# Altium footprint library PCB_LIB.PcbLib: 116 footprints (part 3 of 8)
Each footprint in its own frame and in the unit in brackets; x right, y up, seen from the top. Pads: shape width x height; smd on the part's side, far side on the other; paste and mask are expansions set on the pad; w line width, h text height; cw(c..) or ccw(c..) is an arc to the next point about the centre after c.
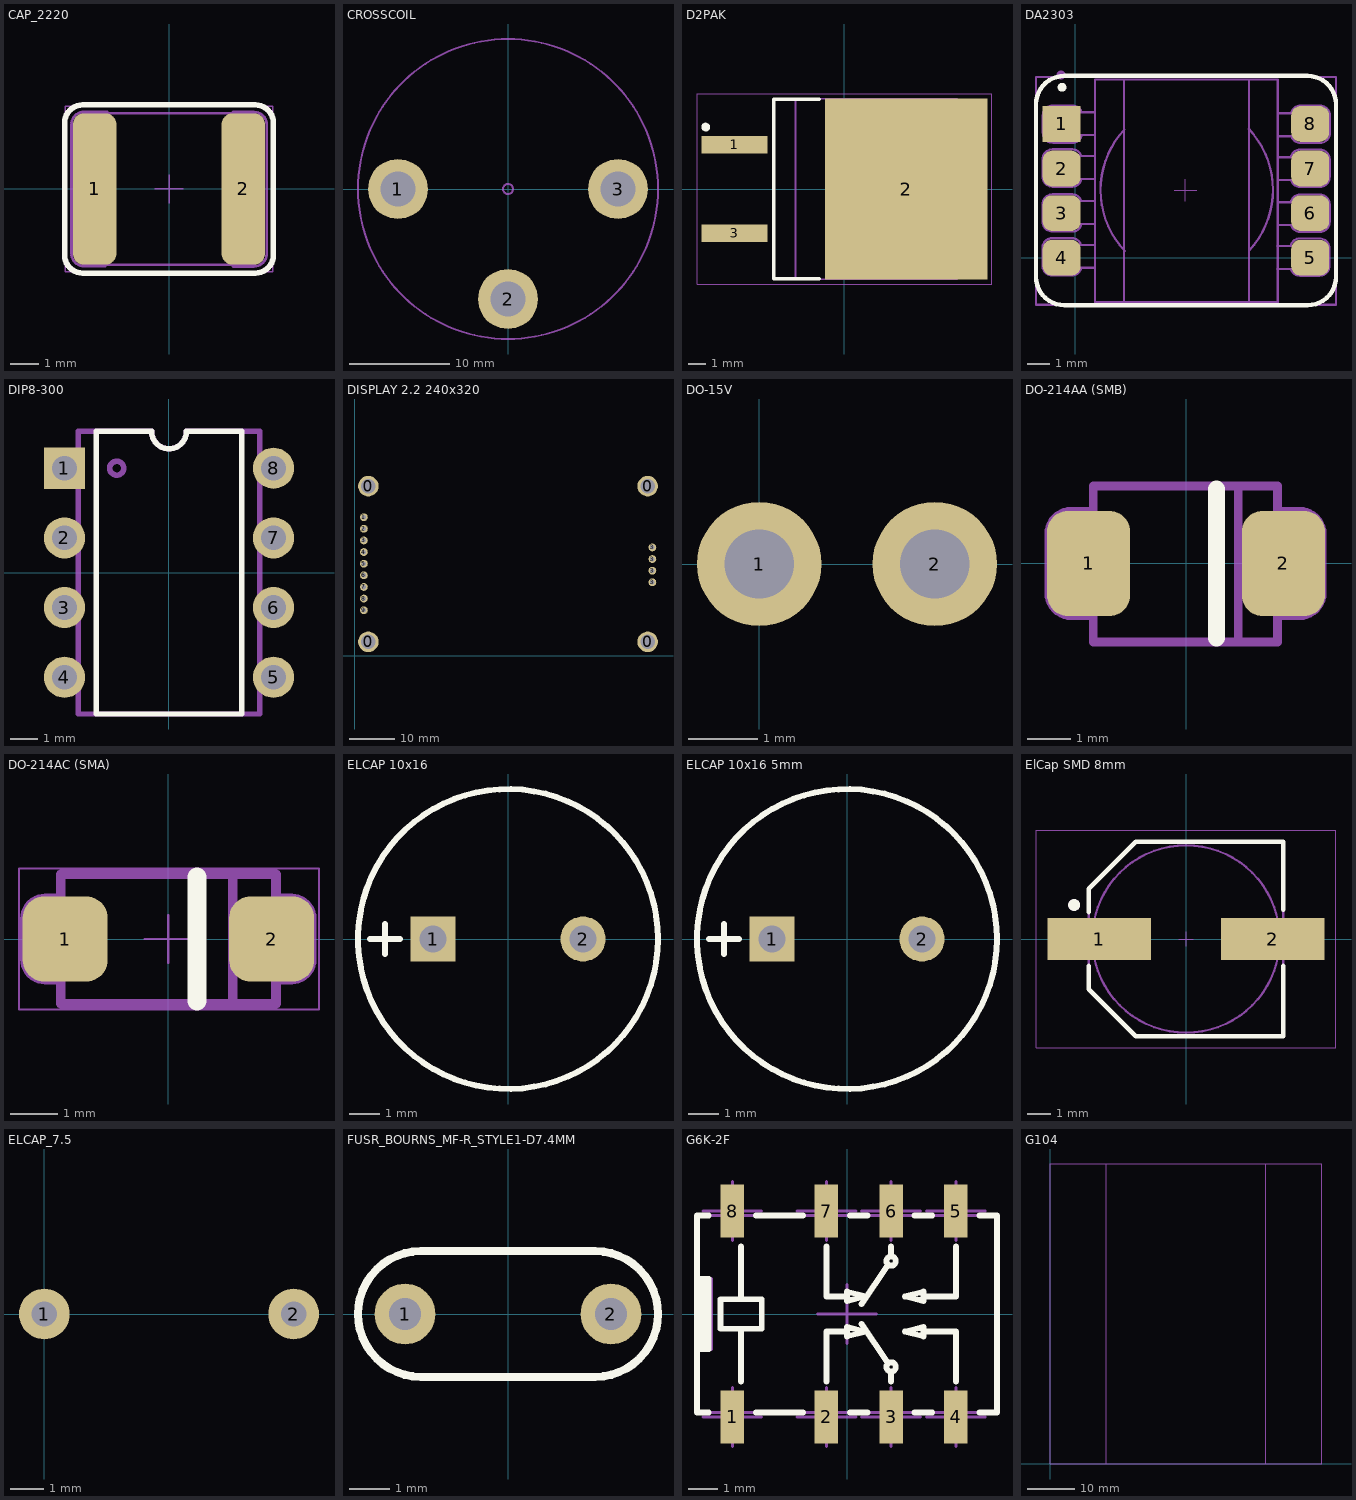
[diagram p2: the footprints below, top view; thin cyan lines are the x and y axes]

## CAP_2220 [mm] "Chip Capacitor, 2-Leads, Body 5.7x5.0mm, IPC Medium Density"
height 2
pads (2):
  rrect50% 1.55x5.4 smd: 1(-2.65,0) 2(2.65,0)
Top Overlay:
  lines w0.2: -3.725,2.3 -3.725,-2.35 ccw(c-3.075,-2.35) -3.075,-3 3.075,-3 ccw(c3.075,-2.35) 3.725,-2.35 ; -3.725,2.35 cw(c-3.075,2.35) -3.075,3 3.075,3 cw(c3.075,2.35) 3.725,2.35 3.725,-2.3
Mechanical 14:
  lines w0.1: -2.275,-2.753 -3.025,-2.753 cw(c-3.025,-2.3) -3.478,-2.3 ; -2.21,2.753 -3.025,2.753 ccw(c-3.025,2.3) -3.478,2.3 ; 2.285,-2.76 3.035,-2.76 ccw(c3.035,-2.307) 3.487,-2.307 3.487,2.293 ccw(c3.035,2.293) 3.035,2.746 2.285,2.746 ; -3.478,-2.3 -3.478,2.3 ; -3.478,-2.3 -3.478,-2.3 ; -3.478,2.3 -3.478,2.3 ; -3.05,-2.7 3.05,-2.7 3.05,2.7 -3.05,2.7 -3.05,-2.7
  text ".Designator" at -5.715,0 h2.8
  text ".Comment" at -1.651,-2.159 h1
Mechanical 15:
  lines w0.05: -0.5,0 0.5,0 ; 0,-0.5 0,0.5 ; -3.7,-2.95 3.7,-2.95 3.7,2.95 -3.7,2.95 -3.7,-2.95
3D body "CAPC5750X200N.stp": height 2, standoff 0, extent -3.05,-2.7 3.05,2.7

## CROSSCOIL [mm]
pads (3):
  round 6 hole 3.5: 1(-11,0) 2(0,-11) 3(11,0)
Mechanical 2:
  circle w0.2: c-11,0 r1.5
  circle w0.2: c11,0 r1.5
  circle w0.2: c0,-11 r1.5
  circle w0.2: c0,0 r0.5
Mechanical 14:
  circle w0.2: c0,0 r15
3D body: height 26, standoff 0, extent -14.999,-14.999 14.999,14.999
3D body: height 29, standoff 26, extent -0.499,-0.499 0.499,0.499
3D body: height 0, standoff -11, extent 9.501,-1.499 12.499,1.499
3D body: height 0, standoff -11, extent -1.499,-12.499 1.499,-9.501
3D body: height 0, standoff -11, extent -12.499,-1.499 -9.501,1.499

## D2PAK [mm] "D2PAK TO-263A, TO,2.54mm pitch;2 pin,15.24mm L X 9.27mm W X 4.57mm H body, IPC Medium Density"
height 4.57
pads (3):
  rect 3.8x1 smd: 1(-6.3,2.54) 3(-6.3,-2.54)
  rect 9.3x10.4 smd: 2(3.55,0)
Top Overlay:
  circle w0.25: c-7.95,3.55 r0.125
  lines w0.2: -1.45,-5.15 -4.05,-5.15 -4.05,5.15 -1.45,5.15
Top Paste:
  region: -0.37,-4.48 1.05,-4.48 1.05,-2.78 -0.37,-2.78
  region: 1.77,-4.48 3.19,-4.48 3.19,-2.78 1.77,-2.78
  region: 3.91,-4.48 5.33,-4.48 5.33,-2.78 3.91,-2.78
  region: 6.05,-4.48 7.47,-4.48 7.47,-2.78 6.05,-2.78
  region: -0.37,-2.06 1.05,-2.06 1.05,-0.36 -0.37,-0.36
  region: 1.77,-2.06 3.19,-2.06 3.19,-0.36 1.77,-0.36
  region: 3.91,-2.06 5.33,-2.06 5.33,-0.36 3.91,-0.36
  region: 6.05,-2.06 7.47,-2.06 7.47,-0.36 6.05,-0.36
  region: -0.37,0.36 1.05,0.36 1.05,2.06 -0.37,2.06
  region: 1.77,0.36 3.19,0.36 3.19,2.06 1.77,2.06
  region: 3.91,0.36 5.33,0.36 5.33,2.06 3.91,2.06
  region: 6.05,0.36 7.47,0.36 7.47,2.06 6.05,2.06
  region: -0.37,2.78 1.05,2.78 1.05,4.48 -0.37,4.48
  region: 1.77,2.78 3.19,2.78 3.19,4.48 1.77,4.48
  region: 3.91,2.78 5.33,2.78 5.33,4.48 3.91,4.48
  region: 6.05,2.78 7.47,2.78 7.47,4.48 6.05,4.48
Mechanical 14:
  lines w0.1: 6.47,-5.08 6.85,-5.08 7.62,-4.226 7.62,4.226 6.85,5.08 6.47,5.08 ; -2.8,-5.17 -2.8,5.17 6.47,5.17 6.47,-5.17 -2.8,-5.17
Mechanical 15:
  lines w0.05: -0.5,0 0.5,0 ; 0,-0.5 0,0.5 ; -8.45,-5.45 -8.45,5.45 8.45,5.45 8.45,-5.45 -8.45,-5.45
3D body "TO254P1524X483-3N.stp": height 4.83, standoff 0, extent -7.622,-5.08 7.623,5.08

## DA2303 [mm]
pads (8):
  rect 1.7x1.6 smd: 1(-0.6,6)
  rrect50% 1.7x1.6 smd: 2(-0.6,4) 3(-0.6,2) 4(-0.6,0) 5(10.55,0) 6(10.55,2) 7(10.55,4) 8(10.55,6)
Top Overlay:
  circle w0.2: c-0.583,7.645 r0.1
  lines w0.2: -1.753,-0.864 ccw(c-0.483,-0.864) -0.483,-2.134 10.439,-2.134 ccw(c10.439,-0.864) 11.709,-0.864 11.709,6.883 ccw(c10.439,6.883) 10.439,8.153 -0.483,8.153 ccw(c-0.483,6.883) -1.753,6.883 -1.753,6.223 -1.753,-0.864
Mechanical 14:
  circle w0.2: c-0.629,8.195 r0.1
  lines w0.1: -1.467,0.024 -1.467,0.424 cw(c-1.017,0.424) -1.017,0.874 -0.142,0.874 cw(c-0.142,0.449) 0.257,0.594 ; -1.467,0.049 -1.467,-0.351 ccw(c-1.017,-0.351) -1.017,-0.801 -0.142,-0.801 ccw(c-0.142,-0.376) 0.257,-0.522 ; -1.456,1.993 -1.456,2.393 cw(c-1.006,2.393) -1.006,2.843 -0.131,2.843 cw(c-0.131,2.418) 0.268,2.564 ; -1.456,2.018 -1.456,1.618 ccw(c-1.006,1.618) -1.006,1.168 -0.131,1.168 ccw(c-0.131,1.593) 0.268,1.448 ; -1.456,4.012 -1.456,4.412 cw(c-1.006,4.412) -1.006,4.862 -0.131,4.862 cw(c-0.131,4.437) 0.268,4.582 ; -1.456,4.037 -1.456,3.637 ccw(c-1.006,3.637) -1.006,3.187 -0.131,3.187 ccw(c-0.131,3.612) 0.268,3.466 ; -1.445,5.981 -1.445,6.381 cw(c-0.995,6.381) -0.995,6.831 -0.12,6.831 cw(c-0.12,6.406) 0.279,6.551 ; -1.445,6.006 -1.445,5.606 ccw(c-0.995,5.606) -0.995,5.156 -0.12,5.156 ccw(c-0.12,5.581) 0.279,5.436 ; 0.878,-0.457 -0.922,-0.457 cw(c-0.922,-0.207) -1.172,-0.207 -1.172,0.318 ; 0.878,0.568 -0.922,0.568 ccw(c-0.922,0.318) -1.172,0.318 ; 0.889,1.512 -0.911,1.512 cw(c-0.911,1.762) -1.161,1.762 -1.161,2.287 ; 0.889,2.537 -0.911,2.537 ccw(c-0.911,2.287) -1.161,2.287 ; 0.889,3.531 -0.911,3.531 cw(c-0.911,3.781) -1.161,3.781 -1.161,4.306 ; 0.889,4.556 -0.911,4.556 ccw(c-0.911,4.306) -1.161,4.306 ; 0.9,5.5 -0.9,5.5 cw(c-0.9,5.75) -1.15,5.75 -1.15,6.275 ; 0.9,6.525 -0.9,6.525 ccw(c-0.9,6.275) -1.15,6.275 ; 2.2,-2 2.2,8 ; 2.204,5.747 ccw(c5.144,3.035) 2.226,0.299 ; 7.799,5.776 cw(c4.881,3.04) 7.821,0.328 ; 7.8,-2 7.8,8 ; 9.071,-0.505 10.871,-0.505 ccw(c10.871,-0.255) 11.121,-0.255 ; 9.071,0.52 10.871,0.52 cw(c10.871,0.27) 11.121,0.27 11.121,-0.255 ; 9.082,1.464 10.882,1.464 ccw(c10.882,1.714) 11.132,1.714 ; 9.082,2.489 10.882,2.489 cw(c10.882,2.239) 11.132,2.239 11.132,1.714 ; 9.082,3.483 10.882,3.483 ccw(c10.882,3.733) 11.132,3.733 ; 9.082,4.508 10.882,4.508 cw(c10.882,4.258) 11.132,4.258 11.132,3.733 ; 9.093,5.452 10.893,5.452 ccw(c10.893,5.702) 11.143,5.702 ; 9.093,6.477 10.893,6.477 cw(c10.893,6.227) 11.143,6.227 11.143,5.702 ; 9.692,-0.532 ccw(c10.091,-0.386) 10.091,-0.811 10.966,-0.811 ccw(c10.966,-0.361) 11.416,-0.361 11.416,0.039 ; 9.692,0.584 cw(c10.091,0.439) 10.091,0.864 10.966,0.864 cw(c10.966,0.414) 11.416,0.414 11.416,0.014 ; 9.703,1.438 ccw(c10.102,1.583) 10.102,1.158 10.977,1.158 ccw(c10.977,1.608) 11.427,1.608 11.427,2.008 ; 9.703,2.554 cw(c10.102,2.408) 10.102,2.833 10.977,2.833 cw(c10.977,2.383) 11.427,2.383 11.427,1.983 ; 9.703,3.456 ccw(c10.102,3.602) 10.102,3.177 10.977,3.177 ccw(c10.977,3.627) 11.427,3.627 11.427,4.027 ; 9.703,4.572 cw(c10.102,4.427) 10.102,4.852 10.977,4.852 cw(c10.977,4.402) 11.427,4.402 11.427,4.002 ; 9.714,5.426 ccw(c10.113,5.571) 10.113,5.146 10.988,5.146 ccw(c10.988,5.596) 11.438,5.596 11.438,5.996 ; 9.714,6.541 cw(c10.113,6.396) 10.113,6.821 10.988,6.821 cw(c10.988,6.371) 11.438,6.371 11.438,5.971 ; -1.172,0.318 ccw(c-1.172,0.318) -1.172,0.318 ; -1.161,2.287 ccw(c-1.161,2.287) -1.161,2.287 ; -1.161,4.306 ccw(c-1.161,4.306) -1.161,4.306 ; -1.15,6.275 ccw(c-1.15,6.275) -1.15,6.275 ; 11.121,-0.255 ccw(c11.121,-0.255) 11.121,-0.255 ; 11.132,1.714 ccw(c11.132,1.714) 11.132,1.714 ; 11.132,3.733 ccw(c11.132,3.733) 11.132,3.733 ; 11.143,5.702 ccw(c11.143,5.702) 11.143,5.702 ; 0.9,-2 9.1,-2 9.1,8 0.9,8 0.9,-2
  text ".Designator" at 2.975,13.325 h5
  text ".Comment" at -3.275,-4.325 h1.5
Mechanical 15:
  lines w0.05: 4.453,3.023 5.453,3.023 ; 4.953,2.523 4.953,3.523
  lines w0.1: -1.753,-2.108 4.902,-2.108 11.709,-2.108 11.709,8.103 -1.753,8.103 -1.753,-2.108
3D body "Coilcraft-DA2303-AL.step": height 5.95, standoff -0.02, extent -1.075,-1.975 10.995,8.025

## DIP8-300 [mm] "DIP 8 Leads, Row Spacing 7.62 mm; Pitch 2.54 mm"
height 5.08
pads (8):
  rect 1.5x1.5 hole 0.9: 1(-3.81,3.81)
  round 1.5 hole 0.9: 2(-3.81,1.27) 3(-3.81,-1.27) 4(-3.81,-3.81) 5(3.81,-3.81) 6(3.81,-1.27) 7(3.81,1.27) 8(3.81,3.81)
Top Overlay:
  lines w0.2: -0.635,5.15 ccw(c0,5.15) 0.635,5.15 ; -0.635,5.15 ccw(c0,5.15) 0.635,5.15 ; -0.635,5.15 -2.65,5.15 -2.65,-5.15 2.65,-5.15 2.65,5.15 0.635,5.15
Mechanical 14:
  circle w0.2: c-1.905,3.81 r0.254
  lines w0.2: -3.3,-5.15 -3.3,5.15 -0.635,5.15 ccw(c0,5.15) 0.635,5.15 3.3,5.15 3.3,-5.15 -3.3,-5.15
  text ".Designator" at 1.225,-5.95 h2.8
3D body "DIP8-300.stp": height 5.33, standoff -3.3, extent -3.935,-5.08 3.935,5.08

## DISPLAY 2.2 240x320 [mm]
pads (17):
  round 4.5 hole 3.2: 0(3,3) 0(3,37) 0(64,3) 0(64,37)
  round 1.7 hole 1: 1(2.032,30.226) 2(2.032,27.686) 3(2.032,25.146) 3(65.024,16.002) 3(65.024,18.542) 3(65.024,21.082) 3(65.024,23.622) 4(2.032,22.606) 5(2.032,20.066) 6(2.032,17.526) 7(2.032,14.986) 8(2.032,12.446) 9(2.032,9.906)
3D body "User Library-TFT22.step": height 17.1, standoff -4, extent 0,0 67,40

## DO-15V [mm]
pads (2):
  round 1.8 hole 1: 1(0,0) 2(2.54,0)
3D body "User Library-DO-15-Vertical_100.STEP": height 11.05, standoff -4, extent -1.78,-1.78 2.97,1.78

## DO-214AA (SMB) [mil] "DO-214-AA/SMB; 2 C-Bend Leads; Body 5.3 x 3.6 mm, inc. leads (LxW)"
height 100
pads (2):
  rrect50% 75x95 smd: 1(-88,0) 2(88,0)
Top Overlay:
  lines w15.75: 27.56,-66.93 27.56,66.93
Mechanical 14:
  lines w7.87: -84.65,-47.24 -103.35,-47.24 cw(c-103.35,-26.57) -124.02,-26.57 -124.02,26.57 cw(c-103.35,26.57) -103.35,47.24 -83.66,47.24 ; -83.66,-37.4 -94.49,-37.4 -94.49,37.4 -83.66,37.4 ; 47.24,-69.88 47.24,69.88 ; 82.68,-47.24 102.36,-47.24 ccw(c102.36,-26.57) 123.03,-26.57 123.03,26.57 ccw(c102.36,26.57) 102.36,47.24 83.66,47.24 ; 82.68,-37.4 93.5,-37.4 93.5,37.4 82.68,37.4 ; -83.66,-70.87 -83.66,69.88 82.68,69.88 82.68,-70.87 -83.66,-70.87
  text ".Designator" at -137.8,-43.31 h70.87
3D body "SMB (DO-214AA).STEP": height 86.65, standoff -1.97, extent -104.34,-72.84 104.32,72.83

## DO-214AC (SMA) [mil] "DO-214-AC/SMA; 2 C-Bend Leads; Body 5 x 2.7 mm, inc. leads (LxW)"
height 96.06
pads (2):
  rrect50% 70x70 smd: 1(-85,0) 2(85,0)
Top Overlay:
  lines w15.75: 23.62,-51.18 23.62,51.18
Mechanical 14:
  lines w7.87: -88.58,-33.46 -101.38,-33.46 cw(c-101.38,-16.73) -118.11,-16.73 -118.11,16.73 cw(c-101.38,16.73) -101.38,33.46 -88.58,33.46 ; -88.58,-26.57 -96.46,-26.57 -96.46,26.57 -88.58,26.57 ; 53.15,-53.15 53.15,53.15 ; 88.58,-33.46 101.38,-33.46 ccw(c101.38,-16.73) 118.11,-16.73 118.11,16.73 ccw(c101.38,16.73) 101.38,33.46 88.58,33.46 ; 88.58,-26.57 96.46,-26.57 96.46,26.57 88.58,26.57 ; -88.58,-53.15 -88.58,53.15 88.58,53.15 88.58,-53.15 -88.58,-53.15
  text ".Designator" at -153.54,-43.31 h70.87
Mechanical 15:
  lines w1.97: -19.68,0 19.68,0 ; 0,-19.68 0,19.68 ; -123.03,-58.07 124.02,-58.07 124.02,58.07 -123.03,58.07 -123.03,4.92 -123.03,-58.07
3D body "SMA (DO-214AC).STEP": height 84.69, standoff -1.97, extent -98.42,-53.15 98.43,53.15

## ELCAP 10x16 [mm] "Capacitor, Radial, Pin spacing 5.0mm - Body Diameter 10.0mm X Body Height 16.0mm"
height 16
pads (2):
  rect 1.5x1.5 hole 0.9: 1(-2.5,0)
  round 1.5 hole 0.9: 2(2.5,0)
Top Overlay:
  circle w0.2: c0,0 r5
  lines w0.2: -4.6,0 -3.6,0 ; -4.1,-0.5 -4.1,0.5
Mechanical 13:
  circle w0.1: c0,0 r5
Mechanical 14:
  circle w0.1: c0,0 r5
  lines w0.1: -4.6,0 -3.6,0 ; -4.1,-0.5 -4.1,0.5
3D body "CAPPR500-1000X1600.stp": height 16, standoff -3.6, extent -5.01,-5.01 4.99,4.99

## ELCAP 10x16 5mm [mm] "Capacitor, Radial, Pin spacing 5.0mm - Body Diameter 10.0mm X Body Height 16.0mm"
height 16
pads (2):
  rect 1.5x1.5 hole 0.9: 1(-2.5,0)
  round 1.5 hole 0.9: 2(2.5,0)
Top Overlay:
  circle w0.2: c0,0 r5
  lines w0.2: -4.6,0 -3.6,0 ; -4.1,-0.5 -4.1,0.5
Mechanical 13:
  circle w0.1: c0,0 r5
Mechanical 14:
  circle w0.1: c0,0 r5
  lines w0.1: -4.6,0 -3.6,0 ; -4.1,-0.5 -4.1,0.5
  text ".Designator" at -5.5,-1.25 h2.8
3D body "CAPPR500-1000X1600.stp": height 16, standoff -3.6, extent -5.01,-5.01 4.99,4.99

## ElCap SMD 8mm [mm] "Capacitor, Aluminium Electrolytric, 8.3mm L X 8.3mm W X 10.2mm H, IPC Medium Density"
height 10.2
pads (2):
  rect 4.4x1.8 smd: 1(-3.7,0) 2(3.7,0)
Top Overlay:
  circle w0.25: c-4.775,1.45 r0.125
  lines w0.2: -4.15,-1.15 -4.15,-2.15 -2.15,-4.15 4.15,-4.15 4.15,-1.15 ; -4.15,1.15 -4.15,2.15 -2.15,4.15 4.15,4.15 4.15,1.25
Mechanical 14:
  circle w0.1: c0,0 r4
  circle w0.25: c-4.775,1.45 r0.125
  lines w0.1: -4.15,-2.15 -4.15,2.15 -2.15,4.15 4.15,4.15 4.15,-4.15 -2.15,-4.15 -4.15,-2.15
Mechanical 15:
  lines w0.05: -0.3,0 0.3,0 ; 0,-0.3 0,0.3 ; -6.4,-4.65 6.4,-4.65 6.4,4.65 -6.4,4.65 -6.4,-4.65
3D body "CAPAE830X1020N.stp": height 10.2, standoff 0, extent -4.75,-4.25 5.25,4.25

## ELCAP_7.5 [mil]
pads (2):
  round 60 hole 30: 1(0,0) 2(295.28,0)

## FUSR_BOURNS_MF-R_STYLE1-D7.4MM [mm] "PTC Resettable Fuse, MF-R Series, Case style 1 Diametre 7.4mm"
height 13.4
pads (2):
  round 1.5 hole 0.8: 1(-2.54,0) 2(2.54,0)
Top Overlay:
  lines w0.2: -3.7,0 cw(c-2.15,0) -2.15,1.55 2.15,1.55 cw(c2.15,0) 3.7,0 cw(c2.15,0) 2.15,-1.55 -2.15,-1.55 cw(c-2.15,0) -3.7,0
Mechanical 14:
  lines w0.1: -3.7,0 cw(c-2.15,0) -2.15,1.55 2.15,1.55 cw(c2.15,0) 3.7,0 cw(c2.15,0) 2.15,-1.55 -2.15,-1.55 cw(c-2.15,0) -3.7,0
  text ".Designator" at -4,-1 h1.9
3D body "FUSR_BOURNS_MF-R_STYLE1-D7.4MM.stp": height 13.4, standoff -3.6, extent -3.699,-1.55 3.699,1.55

## G6K-2F [mm] "SMD Relay,  Body 10.2mm x 6.7mm, OMRON_G6K-2F"
height 5.4
pads (8):
  rect 0.8x1.8 smd: 1(-3.9,-3.5) 2(-0.7,-3.5) 3(1.5,-3.5) 4(3.7,-3.5) 5(3.7,3.5) 6(1.5,3.5) 7(-0.7,3.5) 8(-3.9,3.5)
Top Overlay:
  circle w0.2: c1.5,1.8 r0.159
  circle w0.2: c1.5,-1.8 r0.159
  lines w0.2: -5.1,-1.2 -4.7,-1.2 -4.7,1.2 -5.1,1.2 ; -5,-1.2 -5,1.2 ; -4.9,-1.2 -4.9,1.2 ; -4.8,-1.2 -4.8,1.2 ; -4.7,-3.35 -5.1,-3.35 -5.1,3.35 -4.7,3.35 ; -3.6,-2.3 -3.6,-0.5 ; -3.6,0.5 -3.6,2.3 ; -3.1,-3.35 -1.5,-3.35 ; -3.1,3.35 -1.5,3.35 ; -0.7,-2.3 -0.7,-0.6 0,-0.6 ; -0.7,2.3 -0.7,0.6 0,0.6 ; 0.1,-3.35 0.7,-3.35 ; 0.1,3.35 0.7,3.35 ; 0.493,-0.338 1.4,-1.675 ; 0.493,0.338 1.4,1.675 ; 1.5,-2.3 1.5,-2 ; 1.5,2 1.5,2.3 ; 2.3,-3.35 2.9,-3.35 ; 2.3,3.35 2.9,3.35 ; 2.6,-0.6 3.7,-0.6 3.7,-2.3 ; 2.6,0.6 3.7,0.6 3.7,2.3 ; 4.5,-3.35 5.1,-3.35 5.1,3.35 4.5,3.35 ; -4.3,-0.5 -4.3,0.5 -2.9,0.5 -2.9,-0.5 -4.3,-0.5 ; 0,-0.759 0.635,-0.6 0,-0.441 0,-0.759 ; 0,0.441 0,0.759 0.635,0.6 0,0.441 ; 1.965,-0.6 2.6,-0.759 2.6,-0.441 1.965,-0.6 ; 1.965,0.6 2.6,0.441 2.6,0.759 1.965,0.6
Mechanical 8:
  lines w0.1: -4.9,-3.5 -3.9,-3.5 ; -4.9,3.5 -3.9,3.5 ; -3.9,-4.5 -3.9,-3.5 ; -3.9,-2.5 -3.9,-3.5 ; -3.9,2.5 -3.9,3.5 ; -3.9,4.5 -3.9,3.5 ; -2.9,-3.5 -3.9,-3.5 ; -2.9,3.5 -3.9,3.5 ; -1.7,-3.5 -0.7,-3.5 ; -1.7,3.5 -0.7,3.5 ; -1,0 0,0 ; -0.7,-4.5 -0.7,-3.5 ; -0.7,-2.5 -0.7,-3.5 ; -0.7,2.5 -0.7,3.5 ; -0.7,4.5 -0.7,3.5 ; 0,-1 0,0 ; 0,1 0,0 ; 0.3,-3.5 -0.7,-3.5 ; 0.3,3.5 -0.7,3.5 ; 0.5,-3.5 1.5,-3.5 ; 0.5,3.5 1.5,3.5 ; 1,0 0,0 ; 1.5,-4.5 1.5,-3.5 ; 1.5,-2.5 1.5,-3.5 ; 1.5,2.5 1.5,3.5 ; 1.5,4.5 1.5,3.5 ; 2.5,-3.5 1.5,-3.5 ; 2.5,3.5 1.5,3.5 ; 2.7,-3.5 3.7,-3.5 ; 2.7,3.5 3.7,3.5 ; 3.7,-4.5 3.7,-3.5 ; 3.7,-2.5 3.7,-3.5 ; 3.7,2.5 3.7,3.5 ; 3.7,4.5 3.7,3.5 ; 4.7,-3.5 3.7,-3.5 ; 4.7,3.5 3.7,3.5
Mechanical 14:
  circle w0.1: c1.5,1.8 r0.159
  circle w0.1: c1.5,-1.8 r0.159
  lines w0.1: -5.1,-1.2 -4.6,-1.2 -4.6,1.2 -5.1,1.2 ; -5,-1.2 -5,1.2 ; -4.9,-1.2 -4.9,1.2 ; -4.8,-1.2 -4.8,1.2 ; -4.7,-1.2 -4.7,1.2 ; -3.6,-2.3 -3.6,-0.5 ; -3.6,0.5 -3.6,2.3 ; -0.7,-2.3 -0.7,-0.6 0,-0.6 ; -0.7,2.3 -0.7,0.6 0,0.6 ; 0.493,-0.338 1.4,-1.675 ; 0.493,0.338 1.4,1.675 ; 1.5,-2.3 1.5,-2 ; 1.5,2 1.5,2.3 ; 2.6,-0.6 3.7,-0.6 3.7,-2.3 ; 2.6,0.6 3.7,0.6 3.7,2.3 ; -5.1,-3.35 -5.1,3.35 5.1,3.35 5.1,-3.35 -5.1,-3.35 ; -4.3,-0.5 -4.3,0.5 -2.9,0.5 -2.9,-0.5 -4.3,-0.5 ; 0,-0.759 0.635,-0.6 0,-0.441 0,-0.759 ; 0,0.441 0,0.759 0.635,0.6 0,0.441 ; 1.965,-0.6 2.6,-0.759 2.6,-0.441 1.965,-0.6 ; 1.965,0.6 2.6,0.441 2.6,0.759 1.965,0.6
3D body "REL_OMRON_G6K-2F.stp": height 5.4, standoff 0, extent -5.1,-3.9 5.1,3.9

## G104 [mm]
Mechanical 1:
  lines w0.254: 12,0 12,64 ; 46,0 46,64 ; 0,0 0,64 58,64 58,0 0,0
3D body "Deltron Enclosures-deltron-490-060503-68-corrosion-impact-resistant-enclosure.STEP": height 24, standoff -10, extent 0,0 58.003,64.002